# Altium footprint library Library.PcbLib: 225 footprints (part 14 of 16)
Each footprint in its own frame and in the unit in brackets; x right, y up, seen from the top. Pads: shape width x height; smd on the part's side, far side on the other; paste and mask are expansions set on the pad; w line width, h text height; cw(c..) or ccw(c..) is an arc to the next point about the centre after c.
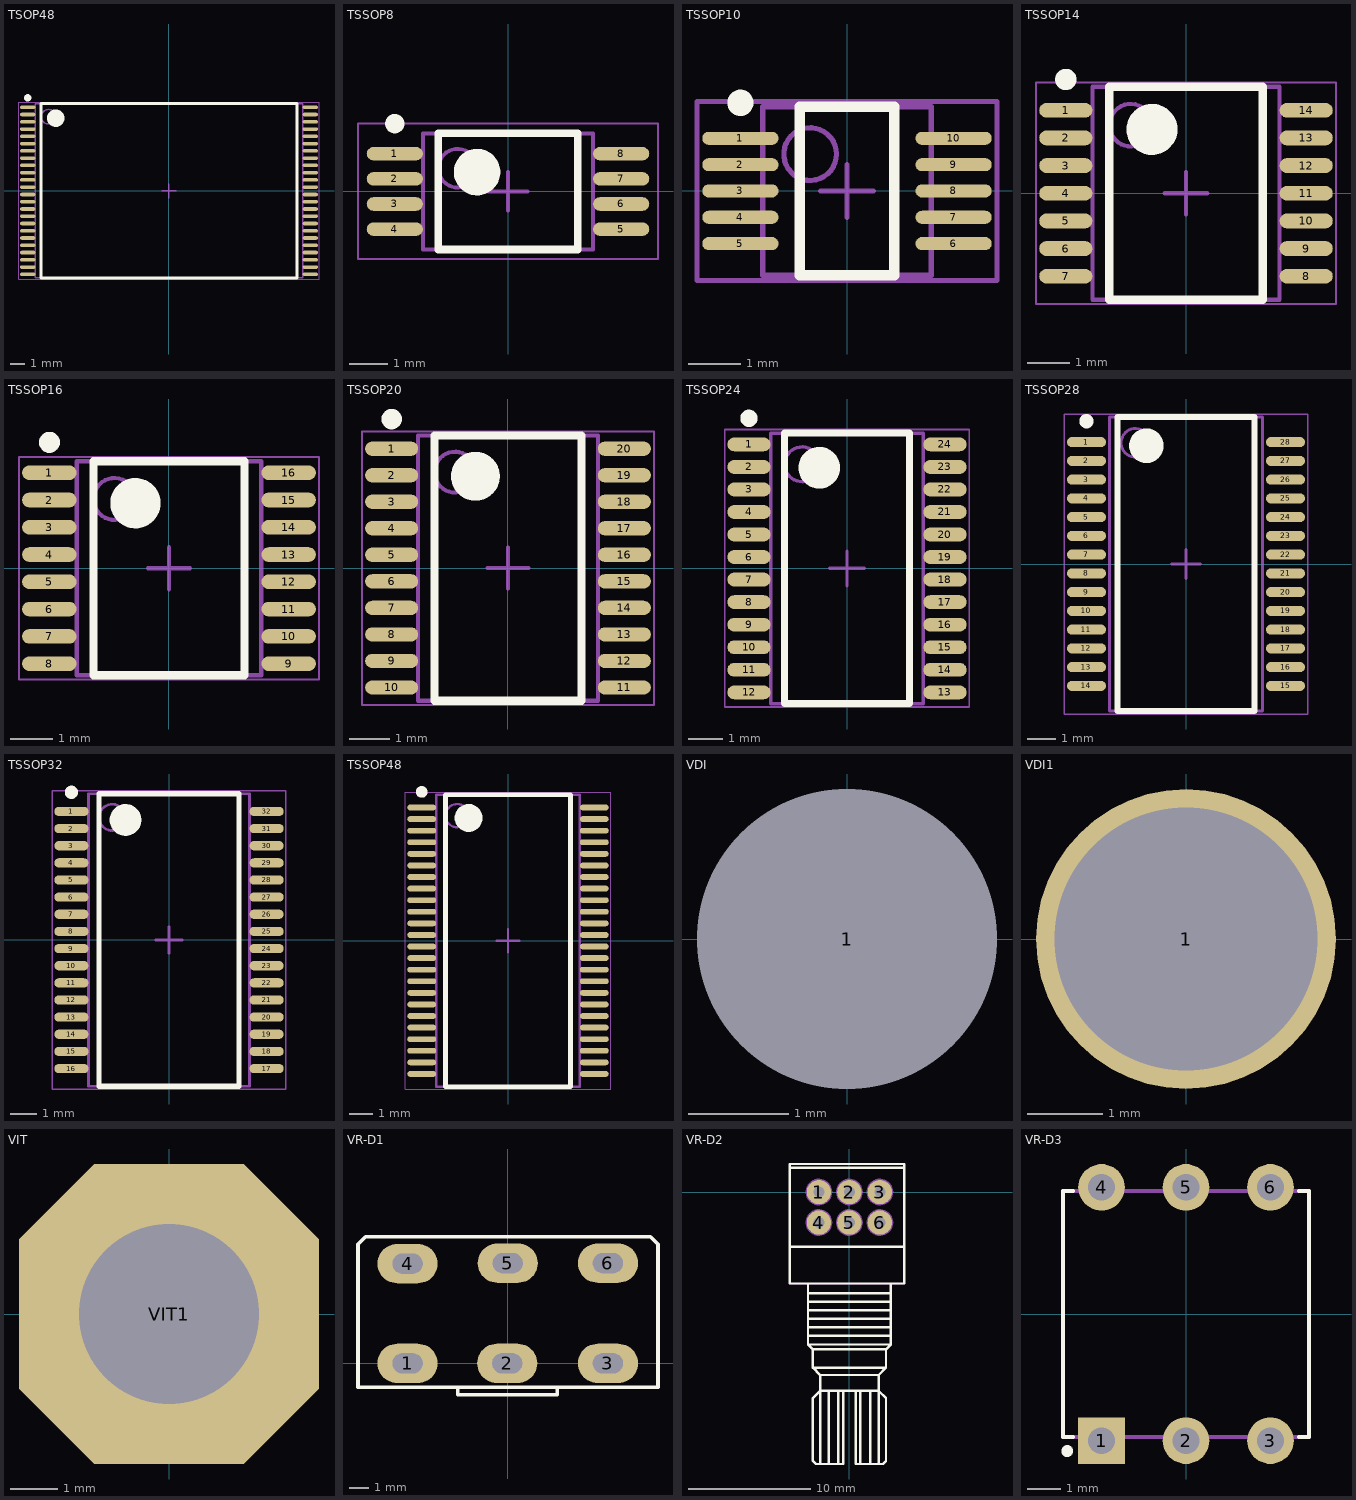
[diagram p13: the footprints below, top view; thin cyan lines are the x and y axes]

## TSOP48 [mm] "TSOP, 48-Leads, Body 12.00x18.40mm, Pitch 0.50mm, IPC High Density"
height 1
pads (48):
  oval 1.05x0.25 smd: 1(-9.725,5.75) 2(-9.725,5.25) 3(-9.725,4.75) 4(-9.725,4.25) 5(-9.725,3.75) 6(-9.725,3.25) 7(-9.725,2.75) 8(-9.725,2.25) 9(-9.725,1.75) 10(-9.725,1.25) 11(-9.725,0.75) 12(-9.725,0.25) 13(-9.725,-0.25) 14(-9.725,-0.75) 15(-9.725,-1.25) 16(-9.725,-1.75) 17(-9.725,-2.25) 18(-9.725,-2.75) 19(-9.725,-3.25) 20(-9.725,-3.75) 21(-9.725,-4.25) 22(-9.725,-4.75) 23(-9.725,-5.25) 24(-9.725,-5.75) 25(9.725,-5.75) 26(9.725,-5.25) 27(9.725,-4.75) 28(9.725,-4.25) 29(9.725,-3.75) 30(9.725,-3.25) 31(9.725,-2.75) 32(9.725,-2.25) 33(9.725,-1.75) 34(9.725,-1.25) 35(9.725,-0.75) 36(9.725,-0.25) 37(9.725,0.25) 38(9.725,0.75) 39(9.725,1.25) 40(9.725,1.75) 41(9.725,2.25) 42(9.725,2.75) 43(9.725,3.25) 44(9.725,3.75) 45(9.725,4.25) 46(9.725,4.75) 47(9.725,5.25) 48(9.725,5.75)
Top Overlay:
  circle w0.25: c-9.725,6.4 r0.125
  circle w0.6: c-7.8,5 r0.3
  lines w0.2: -8.8,-6 -8.8,6 8.8,6 8.8,-6 -8.8,-6
Mechanical 13:
  circle w0.1: c-8.3,5.1 r0.5
  lines w0.1: -9.2,-6 -9.2,6 9.2,6 9.2,-6 -9.2,-6
Mechanical 15:
  lines w0.05: -10.325,-6.1 -10.325,6.1 10.325,6.1 10.325,-6.1 -10.325,-6.1
  lines w0.1: -0.5,0 0.5,0 ; 0,-0.5 0,0.5
3D body "User Library-TSOP48-1.STEP": height 1.2, standoff 0, extent -10.1,-6.05 10.1,6.05

## TSSOP8 [mm] "TSSOP, 8-Leads, Body 3.00x4.40mm, Pitch 0.65mm, IPC Medium Density"
height 1.5
pads (8):
  oval 1.45x0.35 smd: 1(-2.925,0.975) 2(-2.925,0.325) 3(-2.925,-0.325) 4(-2.925,-0.975) 5(2.925,-0.975) 6(2.925,-0.325) 7(2.925,0.325) 8(2.925,0.975)
Top Overlay:
  circle w0.25: c-2.925,1.75 r0.125
  circle w0.6: c-0.8,0.5 r0.3
  lines w0.2: -1.8,-1.5 -1.8,1.5 1.8,1.5 1.8,-1.5 -1.8,-1.5
Mechanical 13:
  circle w0.1: c-1.3,0.6 r0.5
  lines w0.1: -2.2,-1.5 -2.2,1.5 2.2,1.5 2.2,-1.5 -2.2,-1.5
Mechanical 15:
  lines w0.05: -3.875,-1.75 -3.875,1.75 3.875,1.75 3.875,-1.75 -3.875,-1.75
  lines w0.1: -0.5,0 0.5,0 ; 0,-0.5 0,0.5
3D body "User Library-tsop8.step": height 1.2, standoff 0, extent -3.2,-1.55 3.2,1.55

## TSSOP10 [mm] "TSSOP, 10-Leads, Body 3x3mm, Pitch 0.5mm, IPC High Density"
height 1.1
pads (10):
  oval 1.45x0.25 smd: 1(-2.025,1) 2(-2.025,0.5) 3(-2.025,0) 4(-2.025,-0.5) 5(-2.025,-1) 6(2.025,-1) 7(2.025,-0.5) 8(2.025,0) 9(2.025,0.5) 10(2.025,1)
Top Overlay:
  circle w0.25: c-2.025,1.675 r0.125
  lines w0.2: -0.9,-1.6 0.9,-1.6 0.9,1.6 -0.9,1.6 -0.9,-1.6
Mechanical 13:
  circle w0.1: c-0.7,0.7 r0.5
  lines w0.1: -1.6,-1.6 1.6,-1.6 1.6,1.6 -1.6,1.6 -1.6,-1.6
Mechanical 15:
  lines w0.1: -0.5,0 0.5,0 ; 0,-0.5 0,0.5 ; -2.85,-1.7 2.85,-1.7 2.85,1.7 -2.85,1.7 -2.85,-1.7
3D body "User Library-IPC SO.step": height 1.1, standoff 0, extent -2.478,-1.55 2.478,1.55

## TSSOP14 [mm] "TSSOP, 14-Leads, Body 5.00x4.40mm, Pitch 0.65mm, IPC High Density"
height 1
pads (14):
  oval 1.25x0.35 smd: 1(-2.825,1.95) 2(-2.825,1.3) 3(-2.825,0.65) 4(-2.825,0) 5(-2.825,-0.65) 6(-2.825,-1.3) 7(-2.825,-1.95) 8(2.825,-1.95) 9(2.825,-1.3) 10(2.825,-0.65) 11(2.825,0) 12(2.825,0.65) 13(2.825,1.3) 14(2.825,1.95)
Top Overlay:
  circle w0.6: c-0.8,1.5 r0.3
  circle w0.25: c-2.825,2.675 r0.125
  lines w0.2: -1.8,-2.5 1.8,-2.5 1.8,2.5 -1.8,2.5 -1.8,-2.5
Mechanical 13:
  circle w0.1: c-1.3,1.6 r0.5
  lines w0.1: -2.2,-2.5 2.2,-2.5 2.2,2.5 -2.2,2.5 -2.2,-2.5
Mechanical 15:
  lines w0.05: -3.525,-2.6 3.525,-2.6 3.525,2.6 -3.525,2.6 -3.525,-2.6
  lines w0.1: -0.5,0 0.5,0 ; 0,-0.5 0,0.5
3D body "User Library-IPC SO.step": height 1.25, standoff 0, extent -3.228,-2.55 3.228,2.55

## TSSOP16 [mm] "TSSOP, 16-Leads, Body 5.10x4.40mm, Pitch 0.65mm, IPC High Density"
height 1.2
pads (16):
  oval 1.3x0.35 smd: 1(-2.85,2.275) 2(-2.85,1.625) 3(-2.85,0.975) 4(-2.85,0.325) 5(-2.85,-0.325) 6(-2.85,-0.975) 7(-2.85,-1.625) 8(-2.85,-2.275) 9(2.85,-2.275) 10(2.85,-1.625) 11(2.85,-0.975) 12(2.85,-0.325) 13(2.85,0.325) 14(2.85,0.975) 15(2.85,1.625) 16(2.85,2.275)
Top Overlay:
  circle w0.6: c-0.8,1.55 r0.3
  circle w0.25: c-2.85,3 r0.125
  lines w0.2: -1.8,-2.55 1.8,-2.55 1.8,2.55 -1.8,2.55 -1.8,-2.55
Mechanical 13:
  circle w0.1: c-1.3,1.65 r0.5
  lines w0.1: -2.2,-2.55 2.2,-2.55 2.2,2.55 -2.2,2.55 -2.2,-2.55
Mechanical 15:
  lines w0.05: -3.575,-2.65 3.575,-2.65 3.575,2.65 -3.575,2.65 -3.575,-2.65
  lines w0.1: -0.5,0 0.5,0 ; 0,-0.5 0,0.5
3D body "User Library-IPC SO.step": height 1.25, standoff 0, extent -3.228,-2.53 3.228,2.57

## TSSOP20 [mm] "TSSOP, 20-Leads, Body 6.50x4.40mm, Pitch 0.65mm, IPC High Density"
height 1.2
pads (20):
  oval 1.3x0.35 smd: 1(-2.85,2.925) 2(-2.85,2.275) 3(-2.85,1.625) 4(-2.85,0.975) 5(-2.85,0.325) 6(-2.85,-0.325) 7(-2.85,-0.975) 8(-2.85,-1.625) 9(-2.85,-2.275) 10(-2.85,-2.925) 11(2.85,-2.925) 12(2.85,-2.275) 13(2.85,-1.625) 14(2.85,-0.975) 15(2.85,-0.325) 16(2.85,0.325) 17(2.85,0.975) 18(2.85,1.625) 19(2.85,2.275) 20(2.85,2.925)
Top Overlay:
  circle w0.6: c-0.8,2.25 r0.3
  circle w0.25: c-2.85,3.65 r0.125
  lines w0.2: -1.8,-3.25 1.8,-3.25 1.8,3.25 -1.8,3.25 -1.8,-3.25
Mechanical 13:
  circle w0.1: c-1.3,2.35 r0.5
  lines w0.1: -2.2,-3.25 2.2,-3.25 2.2,3.25 -2.2,3.25 -2.2,-3.25
Mechanical 15:
  lines w0.05: -3.575,-3.35 3.575,-3.35 3.575,3.35 -3.575,3.35 -3.575,-3.35
  lines w0.1: -0.5,0 0.5,0 ; 0,-0.5 0,0.5
3D body "User Library-IPC SO.step": height 1.25, standoff 0, extent -3.228,-3.3 3.228,3.3

## TSSOP24 [mm] "TSSOP, 24-Leads, Body 7.80x4.40mm, Pitch 0.65mm, IPC High Density"
height 1.1
pads (24):
  oval 1.25x0.4 smd: 1(-2.825,3.575) 2(-2.825,2.925) 3(-2.825,2.275) 4(-2.825,1.625) 5(-2.825,0.975) 6(-2.825,0.325) 7(-2.825,-0.325) 8(-2.825,-0.975) 9(-2.825,-1.625) 10(-2.825,-2.275) 11(-2.825,-2.925) 12(-2.825,-3.575) 13(2.825,-3.575) 14(2.825,-2.925) 15(2.825,-2.275) 16(2.825,-1.625) 17(2.825,-0.975) 18(2.825,-0.325) 19(2.825,0.325) 20(2.825,0.975) 21(2.825,1.625) 22(2.825,2.275) 23(2.825,2.925) 24(2.825,3.575)
Top Overlay:
  circle w0.6: c-0.8,2.9 r0.3
  circle w0.25: c-2.825,4.325 r0.125
  lines w0.2: -1.8,-3.9 1.8,-3.9 1.8,3.9 -1.8,3.9 -1.8,-3.9
Mechanical 13:
  circle w0.1: c-1.3,3 r0.5
  lines w0.1: -2.2,-3.9 2.2,-3.9 2.2,3.9 -2.2,3.9 -2.2,-3.9
Mechanical 15:
  lines w0.05: -3.525,-4 3.525,-4 3.525,4 -3.525,4 -3.525,-4
  lines w0.1: -0.5,0 0.5,0 ; 0,-0.5 0,0.5
3D body "User Library-IPC SO.step": height 1.25, standoff 0, extent -3.228,-3.95 3.228,3.95

## TSSOP28 [mm] "TSSOP, 28-Leads, Body 10.20x5.30mm, Pitch 0.65mm, IPC High Density"
height 1.2
pads (28):
  oval 1.35x0.35 smd: 1(-3.45,4.225) 2(-3.45,3.575) 3(-3.45,2.925) 4(-3.45,2.275) 5(-3.45,1.625) 6(-3.45,0.975) 7(-3.45,0.325) 8(-3.45,-0.325) 9(-3.45,-0.975) 10(-3.45,-1.625) 11(-3.45,-2.275) 12(-3.45,-2.925) 13(-3.45,-3.575) 14(-3.45,-4.225) 15(3.45,-4.225) 16(3.45,-3.575) 17(3.45,-2.925) 18(3.45,-2.275) 19(3.45,-1.625) 20(3.45,-0.975) 21(3.45,-0.325) 22(3.45,0.325) 23(3.45,0.975) 24(3.45,1.625) 25(3.45,2.275) 26(3.45,2.925) 27(3.45,3.575) 28(3.45,4.225)
Top Overlay:
  circle w0.6: c-1.375,4.1 r0.3
  circle w0.25: c-3.45,4.95 r0.125
  lines w0.2: -2.375,-5.1 2.375,-5.1 2.375,5.1 -2.375,5.1 -2.375,-5.1
Mechanical 13:
  circle w0.1: c-1.75,4.2 r0.5
  lines w0.1: -2.65,-5.1 2.65,-5.1 2.65,5.1 -2.65,5.1 -2.65,-5.1
Mechanical 15:
  lines w0.05: -4.225,-5.2 4.225,-5.2 4.225,5.2 -4.225,5.2 -4.225,-5.2
  lines w0.1: -0.5,0 0.5,0 ; 0,-0.5 0,0.5
3D body "SOP65P770x200-28N.step": height 2.15, standoff 0, extent -3.878,-5.165 3.878,5.165

## TSSOP32 [mm] "TSSOP, 32-Leads, Body 11.10x6.10mm, Pitch 0.65mm, IPC High Density"
height 1.1
pads (32):
  oval 1.3x0.35 smd: 1(-3.7,4.875) 2(-3.7,4.225) 3(-3.7,3.575) 4(-3.7,2.925) 5(-3.7,2.275) 6(-3.7,1.625) 7(-3.7,0.975) 8(-3.7,0.325) 9(-3.7,-0.325) 10(-3.7,-0.975) 11(-3.7,-1.625) 12(-3.7,-2.275) 13(-3.7,-2.925) 14(-3.7,-3.575) 15(-3.7,-4.225) 16(-3.7,-4.875) 17(3.7,-4.875) 18(3.7,-4.225) 19(3.7,-3.575) 20(3.7,-2.925) 21(3.7,-2.275) 22(3.7,-1.625) 23(3.7,-0.975) 24(3.7,-0.325) 25(3.7,0.325) 26(3.7,0.975) 27(3.7,1.625) 28(3.7,2.275) 29(3.7,2.925) 30(3.7,3.575) 31(3.7,4.225) 32(3.7,4.875)
Top Overlay:
  circle w0.25: c-3.7,5.6 r0.125
  circle w0.6: c-1.65,4.55 r0.3
  lines w0.2: -2.65,-5.55 -2.65,5.55 2.65,5.55 2.65,-5.55 -2.65,-5.55
Mechanical 13:
  circle w0.1: c-2.15,4.65 r0.5
  lines w0.1: -3.05,-5.55 -3.05,5.55 3.05,5.55 3.05,-5.55 -3.05,-5.55
Mechanical 15:
  lines w0.05: -4.425,-5.65 -4.425,5.65 4.425,5.65 4.425,-5.65 -4.425,-5.65
  lines w0.1: -0.5,0 0.5,0 ; 0,-0.5 0,0.5
3D body "User Library-TSSOP-32 11_1x6_2.STEP": height 1.1, standoff 0, extent -4.05,-5.55 4.05,5.55

## TSSOP48 [mm] "TSSOP, 48-Leads, Body 12.60x6.20mm, Pitch 0.50mm, IPC High Density"
height 1.1
pads (48):
  oval 1.25x0.25 smd: 1(-3.725,5.75) 2(-3.725,5.25) 3(-3.725,4.75) 4(-3.725,4.25) 5(-3.725,3.75) 6(-3.725,3.25) 7(-3.725,2.75) 8(-3.725,2.25) 9(-3.725,1.75) 10(-3.725,1.25) 11(-3.725,0.75) 12(-3.725,0.25) 13(-3.725,-0.25) 14(-3.725,-0.75) 15(-3.725,-1.25) 16(-3.725,-1.75) 17(-3.725,-2.25) 18(-3.725,-2.75) 19(-3.725,-3.25) 20(-3.725,-3.75) 21(-3.725,-4.25) 22(-3.725,-4.75) 23(-3.725,-5.25) 24(-3.725,-5.75) 25(3.725,-5.75) 26(3.725,-5.25) 27(3.725,-4.75) 28(3.725,-4.25) 29(3.725,-3.75) 30(3.725,-3.25) 31(3.725,-2.75) 32(3.725,-2.25) 33(3.725,-1.75) 34(3.725,-1.25) 35(3.725,-0.75) 36(3.725,-0.25) 37(3.725,0.25) 38(3.725,0.75) 39(3.725,1.25) 40(3.725,1.75) 41(3.725,2.25) 42(3.725,2.75) 43(3.725,3.25) 44(3.725,3.75) 45(3.725,4.25) 46(3.725,4.75) 47(3.725,5.25) 48(3.725,5.75)
Top Overlay:
  circle w0.25: c-3.725,6.425 r0.125
  circle w0.6: c-1.7,5.3 r0.3
  lines w0.2: -2.7,-6.3 -2.7,6.3 2.7,6.3 2.7,-6.3 -2.7,-6.3
Mechanical 13:
  circle w0.1: c-2.2,5.4 r0.5
  lines w0.1: -3.1,-6.3 -3.1,6.3 3.1,6.3 3.1,-6.3 -3.1,-6.3
Mechanical 15:
  lines w0.05: -4.425,-6.4 -4.425,6.4 4.425,6.4 4.425,-6.4 -4.425,-6.4
  lines w0.1: -0.5,0 0.5,0 ; 0,-0.5 0,0.5
3D body "User Library-TSSOP-48 12_6x6_2.STEP": height 1.1, standoff 0, extent -4.05,-6.3 3.95,6.3

## VDI [mm] "SMD Steel Spacer with internal Thread"
height 11.4
pads (3):
  round 2 hole 3 unplated: 1(0,0)
  round 0 smd paste-2539.97: 1(0,0)
  round 0 smd far side paste-2539.97: 1(0,0)

## VDI1 [mm] "SMD Steel Spacer with internal Thread"
height 11.4
pads (1):
  round 4 hole 3.5: 1(0,0)

## VIT [mm] "VIT"
height 0.005
pads (1):
  oct 6.35x6.35 hole 3.81: VIT1(0,0)

## VR-D1 [mil] "Volume control Dual"
height 400
pads (6):
  oval 120x78.74 hole 40 slot 60 at 0 deg: 1(-200,0) 2(-1,0) 3(200,0) 4(-200,199) 5(0,200) 6(200,200)
Top Overlay:
  lines w7: -100,-48 -100,-63 99,-63 99,-48 ; -299,-48 300,-48 300,238 285,253 -284,253 -299,238 -299,-48
3D body "SW3dPS-ALPHA-potentiometer stereo PCB mount.STEP": height 834.65, standoff -129.92, extent -338.65,-1309.27 330.65,299

## VR-D2 [mm]
height 11.3
pads (6):
  round 2 hole 0.9: 1(-2.5,0) 2(0,0) 3(2.5,0) 4(-2.5,-2.5) 5(0,-2.5) 6(2.5,-2.5)
Top Overlay:
  lines w0.2: -4.9,-4.5 4.5,-4.5 ; -4.9,2 4.5,2 ; -3.4,-11.8 3.4,-11.8 3.4,-12.5 ; -3.4,-11.1 3.4,-11.1 ; -3.4,-10.4 3.4,-10.4 ; -3.4,-9.7 3.4,-9.7 ; -3.4,-9 3.4,-9 ; -3.4,-8.3 3.4,-8.3 ; -3.4,-7.5 -3.4,-12.5 ; -2.4,-22.3 -2.4,-16.3 ; -1.7,-22.3 -1.7,-16.3 ; -0.9,-22.3 -0.9,-16.3 ; -0.5,-16.3 -0.5,-22.3 -2.75,-22.3 -3,-22.05 -3,-16.9 -2.4,-16.3 ; 0.5,-16.3 0.5,-22.3 2.75,-22.3 3,-22.05 3,-16.9 2.4,-16.3 ; 0.9,-22.3 0.9,-16.3 ; 1.7,-22.3 1.7,-16.3 ; 2.4,-22.3 2.4,-16.3 ; 3.4,-7.5 3.4,-12.5 ; -3.4,-12.5 -3,-12.9 ; -3.4,-12.5 0,-12.5 3.4,-12.5 ; -3,-14.4 -2.4,-15 ; -3,-14.4 -3,-12.9 ; -3,-14.4 0,-14.4 3,-14.4 ; -3,-12.9 0,-12.9 3,-12.9 ; -2.4,-16.3 -2.4,-15 ; -2.4,-16.3 0,-16.3 2.4,-16.3 ; -2.4,-15 0,-15 2.4,-15 ; 2.4,-16.3 2.4,-15 ; 2.4,-15 3,-14.4 ; 3,-14.4 3,-12.9 ; 3,-12.9 3.4,-12.5 ; -4.9,-7.5 4.5,-7.5 4.5,2.3 -4.9,2.3 -4.9,-7.5
Mechanical 7:
  circle w0.2: c-2.5,0 r1
  circle w0.2: c0,0 r1
  circle w0.2: c2.5,0 r1
  circle w0.2: c-2.5,-2.5 r1
  circle w0.2: c0,-2.5 r1
  circle w0.2: c2.5,-2.5 r1
  lines w0.1: -4.9,-4.5 4.5,-4.5 ; -4.9,2 4.5,2 ; -3.4,-11.8 3.4,-11.8 3.4,-12.5 ; -3.4,-11.1 3.4,-11.1 ; -3.4,-10.4 3.4,-10.4 ; -3.4,-9.7 3.4,-9.7 ; -3.4,-9 3.4,-9 ; -3.4,-8.3 3.4,-8.3 ; -3.4,-7.5 -3.4,-12.5 ; -2.4,-22.3 -2.4,-16.3 ; -1.7,-22.3 -1.7,-16.3 ; -0.9,-22.3 -0.9,-16.3 ; -0.5,-16.3 -0.5,-22.3 -2.75,-22.3 -3,-22.05 -3,-16.9 -2.4,-16.3 ; 0.5,-16.3 0.5,-22.3 2.75,-22.3 3,-22.05 3,-16.9 2.4,-16.3 ; 0.9,-22.3 0.9,-16.3 ; 1.7,-22.3 1.7,-16.3 ; 2.4,-22.3 2.4,-16.3 ; 3.4,-7.5 3.4,-12.5 ; -3.4,-12.5 0,-12.5 3.4,-12.5 ; -3.4,-12.5 -3,-12.9 ; -3,-14.4 0,-14.4 3,-14.4 ; -3,-14.4 -3,-12.9 ; -3,-14.4 -2.4,-15 ; -3,-12.9 0,-12.9 3,-12.9 ; -2.4,-16.3 0,-16.3 2.4,-16.3 ; -2.4,-16.3 -2.4,-15 ; -2.4,-15 0,-15 2.4,-15 ; 2.4,-16.3 2.4,-15 ; 2.4,-15 3,-14.4 ; 3,-14.4 3,-12.9 ; 3,-12.9 3.4,-12.5 ; -4.9,-7.5 -4.9,2.3 4.5,2.3 4.5,-7.5 -4.9,-7.5
3D body "Potentiometer 2x5K Linear.stp": height 12.64, standoff -2.5, extent -5.73,-27.97 5.768,1.504

## VR-D3 [mm]
height 3.65
pads (6):
  rect 1.4x1.4 hole 0.8: 1(-2.54,-3.81)
  round 1.4 hole 0.8: 2(0,-3.81) 3(2.54,-3.81) 4(-2.54,3.81) 5(0,3.81) 6(2.54,3.81)
Top Overlay:
  circle w0.3: c-3.57,-4.12 r0.028
  lines w0.127: -3.4,-3.7 -3.7,-3.7 -3.7,3.7 -3.4,3.7 ; 3.4,-3.7 3.7,-3.7 3.7,3.7 3.4,3.7 ; -3.4,3.7 -3.4,3.7 ; 3.4,3.7 3.4,3.7
Mechanical 13:
  lines w0.127: -3.7,-3.7 3.7,-3.7 3.7,3.7 -3.7,3.7 -3.7,-3.7
3D body "42854732091x_10 Position.stp": height 3.74, standoff -3.46, extent -3.7,-3.935 3.7,3.935